# Altium schematic symbol library Altium_Lib.SchLib: 403 symbols (part 4 of 4)
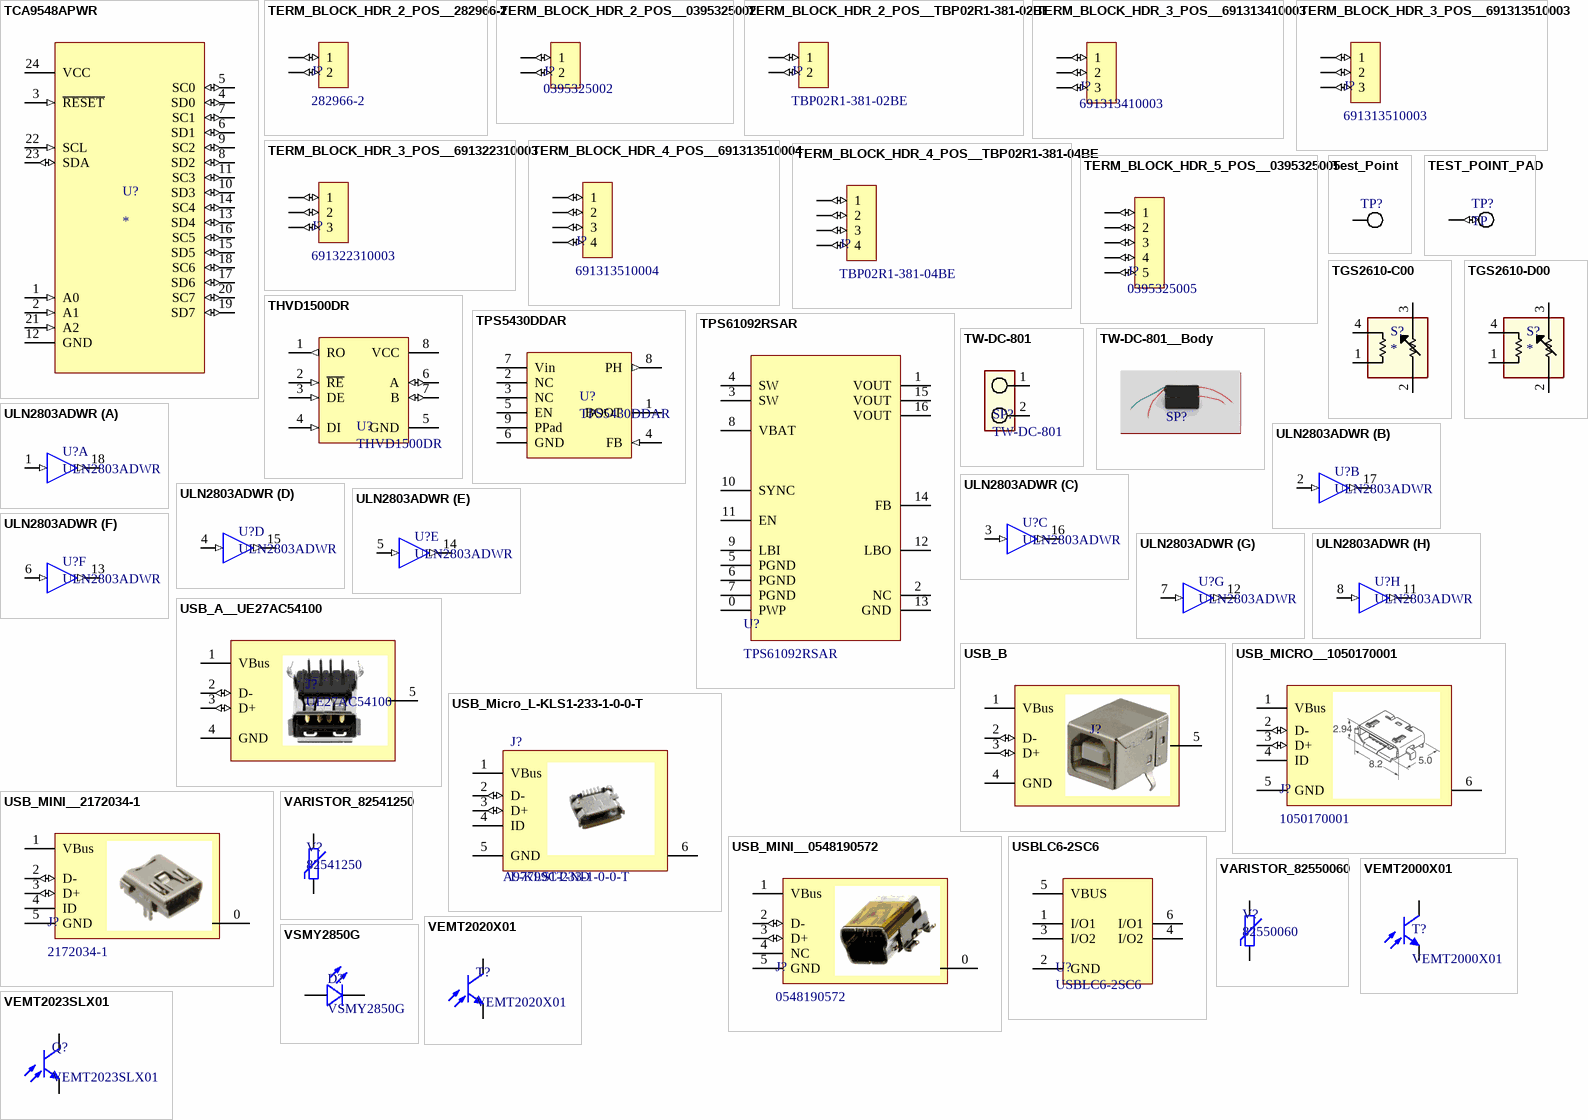
[diagram p14: symbols TCA9548APWR to VSMY2850G]

## TCA9548APWR
designator U?
IC I2C SW 8CH W/RESET 24TSSOP; Manufacturer: Texas Instruments; Manufacturer Part Number: TCA9548APWR; Max Supply Voltage: 5.5V; Min Supply Voltage: 1.65V; On-State Resistance: 70R; Max Supply Current: 80uA; Supply Type: Single; Independent Circuits: 1; Supplier 1: Digi-Key; RoHS: Yes; Category: Decoders and Multiplexers; Mount: Surface Mount; Case/Package: TSSOP; Number of Pins: 24; Contact Plating: Gold; Min Operating Temperature: -40°C; Max Operating Temperature: 85°C; Packaging: Tape and Reel; Package Quantity: 1; Series: TCA; REACH SVHC: No SVHC; Lead Free: Lead Free; RoHS Compliant: Yes; ComponentLink1URL: https://datasheet.ciiva.com/6614/tca9548a-6614721.pdf?src-supplier=Digi-Key; ComponentLink1Description: Datasheet; Supplier Part Number 1: 296-34905-1-ND
footprint TSSOP-24_N (TSOP, 24-Leads, Body 7,80x4,40mm, Pitch 0,65mm, IPC Medium Density)
pins: 1 A0 (in), 2 A1 (in), 3 ~{RESET} (in), 4 SD0 (io), 5 SC0 (io), 6 SD1 (io), 7 SC1 (io), 8 SD2 (io), 9 SC2 (io), 10 SD3 (io), 11 SC3 (io), 12 GND (power), 13 SD4 (io), 14 SC4 (io), 15 SD5 (io), 16 SC5 (io), 17 SD6 (io), 18 SC6 (io), 19 SD7 (io), 20 SC7 (io), 21 A2 (in), 22 SCL (in), 23 SDA (io), 24 VCC (power)

## TERM_BLOCK_HDR_2_POS__282966-2
designator J?, comment 282966-2
TERM BLOCK HDR 2POS 90DEG 7.62MM; Manufacturer: TE Connectivity; Current Rating: 15 A; Mounting Angle: Right; Number of Positions: 2 Position; Voltage Rating: 300 VAC; Supplier 1: Mouser; Manufacturer Part Number: 282966-2; RoHS: RoHS Compliant; Category: Pluggable Terminal Blocks; Stock 1: 79; Pricing 1: 1=1.15, 10=0.554, 100=0.462, 500=0.438, 1000=0.392, 2500=0.369, 5000=0.307, 10000=0.300, 25000=0.294 (USD); Contact Plating: Tin; Housing Material: Polyamide (PA); Packaging: Bulk; Product: Headers; Brand: TE Connectivity; Contact Material: Phosphor Bronze; Flammability Rating: UL 94 V-0; Pitch: 7.62 mm; Product Type: Pluggable Terminal Blocks; Standard Pack Qty: 200; Subcategory: Terminal Blocks; RoHS - Mouser: Y; Minimum Order Quantity: 1; Reeling: False; Supplier Part Number 1: 571-282966-2
footprint KLO_90_762_2
pins: 1 (io), 2 (io)

## TERM_BLOCK_HDR_2_POS__0395325002
designator J?, comment 0395325002
TERM BLOCK HDR 2POS 90DEG 5.08MM; Manufacturer: Molex, LLC; Header Orientation: 90°, Right Angle; Pitch: 0.200" (5.08mm); Number of Levels: 1; Positions Per Level: 2; Contact Tail Length: 0.150" (3.81mm); Material Flammability Rating: UL94 V-0; Packaging: Bulk; RoHS: RoHS Compliant; Number of Positions: 2; Part Status: Active; Type: Header, Male Pins, Shrouded (2 Side); Supplier: Digi-Key; Category: Connectors, Interconnects; Manufacturer Part Number: 0395325002; Insulation Height: 0.327" (8.30mm); Contact Material: Brass; Housing Material: Polyamide (PA66), Nylon 6/6; Wire Strip Length: -; Torque - Screw: -; Screw Size: -; Ingress Protection: -; Wire Gauge or Range - AWG: -; Current - IEC: -; Features: -; Contact Mating Finish: Tin; Mounting Type: Through Hole; Operating Temperature: -40°C ~ 105°C; Plug Wire Entry: -; Color: Green; Termination Style: Solder; Wire Gauge or Range - mm²: -; ComponentLink1URL: https://www.molex.com/pdm_docs/sd/395320002_sd.pdf; ComponentLink1Description: https://www.molex.com/pdm_docs/sd/395320002_sd.pdf; Supplier Part Number: 0395325002-ND
footprint KLO_90_508_2
pins: 1 (io), 2 (io)

## TERM_BLOCK_HDR_2_POS__TBP02R1-381-02BE
designator J?, comment TBP02R1-381-02BE
TERMINAL BLOCK, PLUGGABLE, 3.81,; Manufacturer: CUI Devices; Manufacturer Part Number: TBP02R1-381-02BE; Minimum Order Quantity: 1
footprint KLO_90_381_2__TBP02R1-381-02BE (Connector; Header; 2 Position)
pins: 1 (io), 2 (io)

## TERM_BLOCK_HDR_3_POS__691313410003
designator J?, comment 691313410003
TERM BLOCK HDR 3POS 90DEG 7.62MM; Manufacturer: Wurth Electronics Inc.; Material Flammability Rating: UL94 V-0; Contact Tail Length: 0.157" (4.00mm); Pitch: 0.300" (7.62mm); Number of Levels: 1; Number of Positions: 3; Header Orientation: 90°, Right Angle; Ingress Protection: -; Operating Temperature: -40°C ~ 105°C; Color: Green; Features: -; Wire Strip Length: -; Mounting Type: Through Hole; Screw Size: -; Current - IEC: -; Contact Mating Finish: Tin; Insulation Height: 0.335" (8.51mm); Contact Material: Brass; Housing Material: Polybutylene Terephthalate (PBT); Torque - Screw: -; Wire Gauge or Range - mm²: -; Wire Gauge or Range - AWG: -; Termination Style: Solder; Part Status: Active; Type: Header, Male Pins, Shrouded (4 Side); Category: Connectors, Interconnects; Manufacturer Part Number: 691313410003; Packaging: Bulk; Plug Wire Entry: -; Positions Per Level: 3; RoHS: RoHS Compliant; Supplier: Digi-Key; ComponentLink1URL: http://katalog.we-online.de/em/datasheet/6913134100xx.pdf; ComponentLink1Description: http://katalog.we-online.de/em/datasheet/6913134100xx.pdf; Pricing: 260=0.571 (USD); Supplier Part Number: 732-2836-ND
footprint KLO_90_762_3
pins: 1 (io), 2 (io), 3 (io)

## TERM_BLOCK_HDR_3_POS__691313510003
designator J?, comment 691313510003
TERM BLOCK HDR 3POS 90DEG 5.08MM; Manufacturer: Wurth Elektronik; Supplier 1: Mouser; Manufacturer Part Number: 691313510003; RoHS: RoHS Compliant; Category: Pluggable Terminal Blocks; Stock 1: 298; Pricing 1: 1=0.630, 10=0.550, 50=0.475 (USD); Packaging: Bulk; Series: WR-TBL; Brand: Wurth Elektronik; Product Type: Pluggable Terminal Blocks; Standard Pack Qty: 450; Subcategory: Terminal Blocks; RoHS - Mouser: Y; Minimum Order Quantity: 1; Reeling: False; ComponentLink1URL: https://www.mouser.com/datasheet/2/445/691313510003-1719651.pdf; ComponentLink1Description: https://www.mouser.com/datasheet/2/445/691313510003-1719651.pdf; Supplier Part Number 1: 710-691313510003
footprint KLO_90_508_3
pins: 1 (io), 2 (io), 3 (io)

## TERM_BLOCK_HDR_3_POS__691322310003
designator J?, comment 691322310003
TERM BLOCK HDR 3POS 90DEG 3.81MM; Manufacturer: Wurth Elektronik; Connection Method: Push-In; Current Rating: 10 A; Mounting Angle: Right Angle; Mounting Method: PCB Mount; Number of Positions: 3 Position; Voltage Rating: 300 VAC; Supplier 1: Mouser; Manufacturer Part Number: 691322310003; RoHS: RoHS Compliant; Category: Pluggable Terminal Blocks; Stock 1: 677; Pricing 1: 1=0.630, 10=0.550, 50=0.475 (USD); Color: Green; Contact Plating: Tin; Height: 9.2 mm; Housing Material: Polyamide (PA); Length: 12.62 mm; Packaging: Bulk; Product: Headers; Series: WR-TBL; Termination Style: Through Hole; Width: 7.2 mm; Brand: Wurth Elektronik; Contact Material: Brass; Flammability Rating: UL 94 V-0; Pitch: 3.81 mm; Product Type: Pluggable Terminal Blocks; Standard Pack Qty: 600; Subcategory: Terminal Blocks; RoHS - Mouser: Y; Minimum Order Quantity: 1; Reeling: False; ComponentLink1URL: https://www.mouser.com/datasheet/2/445/691322310003-1719737.pdf; ComponentLink1Description: https://www.mouser.com/datasheet/2/445/691322310003-1719737.pdf; Supplier Part Number 1: 710-691322310003
footprint KLO_90_381_3
pins: 1 (io), 2 (io), 3 (io)

## TERM_BLOCK_HDR_4_POS__691313510004
designator J?, comment 691313510004
TERM BLOCK HDR 4POS 90DEG 5.08MM; Manufacturer: Wurth Elektronik; Current Rating: 20 A; Mounting Angle: Right Angle; Mounting Method: PCB Mount; Number of Positions: 4 Position; Voltage Rating: 300 VAC; Supplier 1: Mouser; Manufacturer Part Number: 691313510004; RoHS: RoHS Compliant; Category: Pluggable Terminal Blocks; Stock 1: 223; Pricing 1: 1=0.780, 10=0.688, 50=0.594 (USD); Color: Green; Contact Plating: Tin; Height: 8.5 mm; Housing Material: Polybutylene Terephthalate (PBT); Length: 22.32 mm; Packaging: Bulk; Product: Headers; Series: WR-TBL; Termination Style: Through Hole; Width: 12 mm; Brand: Wurth Elektronik; Contact Material: Brass; Flammability Rating: UL 94 V-0; Pitch: 5.08 mm; Product Type: Pluggable Terminal Blocks; Standard Pack Qty: 300; Subcategory: Terminal Blocks; RoHS - Mouser: Y; Minimum Order Quantity: 1; Reeling: False; ComponentLink1URL: https://www.mouser.com/datasheet/2/445/691313510004-1719622.pdf; ComponentLink1Description: https://www.mouser.com/datasheet/2/445/691313510004-1719622.pdf; Supplier Part Number 1: 710-691313510004
footprint KLO_90_508_4
pins: 1 (io), 2 (io), 3 (io), 4 (io)

## TERM_BLOCK_HDR_4_POS__TBP02R1-381-04BE
designator J?, comment TBP02R1-381-04BE
Pluggable Terminal Blocks 2 24 Poles, Pluggable,Receptacle, Horizontal, 3.81 Pitch, Terminal Block Connector; Manufacturer: Mouser Electronics; Product Status: New Product; Supplier 1: Mouser; Manufacturer Part Number: TBP02R1-381-04BE; RoHS: RoHS Compliant; Category: Daily Limit Reached; Stock 1: 0; Pricing 1: 1=0.00 (EUR); Minimum Order Quantity: 1; Reeling: False
footprint KLO_90_381_4__TBP02R1-381-04BE (Connector; Header; 4 Position)
pins: 1 (io), 2 (io), 3 (io), 4 (io)

## TERM_BLOCK_HDR_5_POS__0395325005
designator J?, comment 0395325005
TERM BLOCK HDR 5POS 90DEG 5.08MM; Manufacturer: Molex, LLC; Contact Tail Length: 0.150" (3.81mm); Number of Positions: 5; Pitch: 0.200" (5.08mm); Number of Levels: 1; Header Orientation: 90°, Right Angle; Material Flammability Rating: UL94 V-0; Contact Material: Brass; Insulation Height: 0.327" (8.30mm); Housing Material: Polyamide (PA66), Nylon 6/6; Features: -; RoHS: RoHS Compliant; Wire Gauge or Range - AWG: -; Mounting Type: Through Hole; Color: Green; Termination Style: Solder; Packaging: Bulk; Type: Header, Male Pins, Shrouded (2 Side); Wire Gauge or Range - mm²: -; Current - IEC: -; Wire Strip Length: -; Plug Wire Entry: -; Part Status: Active; Contact Mating Finish: Tin; Operating Temperature: -40°C ~ 105°C; Ingress Protection: -; Torque - Screw: -; Manufacturer Part Number: 0395325005; Screw Size: -; Supplier: Digi-Key; Positions Per Level: 5; Category: Connectors, Interconnects; ComponentLink1URL: https://www.molex.com/pdm_docs/sd/395320002_sd.pdf; ComponentLink1Description: https://www.molex.com/pdm_docs/sd/395320002_sd.pdf; Supplier Part Number: 0395325005-ND
footprint KLO_90_508_5
pins: 1 (io), 2 (io), 3 (io), 4 (io), 5 (io)

## Test_Point
designator TP?, comment TP1  (value not drawn)  (no BOM)
Test point; ComponentLink1Description: *; Manufacturer Part Number: TP1; Manufacturer: *
footprint Test_Point_T1
pins: 1 (power)

## TEST_POINT_PAD
designator TP?, comment TP  (no BOM)
Test Point Pad; Manufacturer Part Number: TP; Manufacturer: *; ComponentLink1Description: *
footprint TEST_POINT_T2
pins: 1 (io)

## TGS2610-C00
designator S?
Gas Sensor; Manufacturer: FIGARO; Manufacturer Part Number: TGS2610-C00; Category: Gas Sensor; ComponentLink1Description: http://www.figaro.co.jp/en/product/docs/tgs2610_product_information_rev03.pdf; Mounting Type: Through Hole
footprint TO-5
pins: 1 (power), 2 (power), 3 (power), 4 (power)

## TGS2610-D00
designator S?
Gas Sensor; Manufacturer: FIGARO; Manufacturer Part Number: TGS2610-D00; Category: Gas Sensor; ComponentLink1Description: http://www.figaro.co.jp/en/product/docs/tgs2610_product_information_rev03.pdf; Mounting Type: Through Hole
footprint TO-5
footprint TO-5__90
pins: 1 (power), 2 (power), 3 (power), 4 (power)

## THVD1500DR
designator U?
THVD1500 300 kbps RS-485 Transceivers With ±8-kV IEC ESD Protection; Manufacturer: Texas Instruments; Duplex: Half; Protocol: RS485; Number of Drivers/Receivers: 1/1; Voltage - Supply: 4.5 V ~ 5.5 V; Supplier Device Package: 8-SOIC; Packaging: Cut Tape (CT); Part Status: Active; Package / Case: 8-SOIC (0.154", 3.90mm Width); Operating Temperature: -40°C ~ 125°C; RoHS: Request Inventory Verification; Supplier: Digi-Key; Data Rate: 300kbps; Category: Integrated Circuits (ICs); Type: Transceiver; Manufacturer Part Number: THVD1500DR; Mounting Type: Surface Mount; ComponentLink1URL: http://www.ti.com/lit/ds/symlink/thvd1500.pdf; ComponentLink1Description: http://www.ti.com/lit/ds/symlink/thvd1500.pdf; Pricing: 1=1.32, 10=1.176, 100=0.9168, 500=0.75736, 1000=0.59792 (USD); Supplier Part Number: 296-48170-1-ND
footprint SOIC-8_L (SOIC, 8-Leads, Body 4.9x3.9mm, Pitch 1.27mm, IPC High Density)
pins: 1 RO (out), 2 ~{RE} (in), 3 DE (in), 4 DI (in), 5 GND (power), 6 A (io), 7 B (io), 8 VCC (power)

## TPS5430DDAR
designator U?
IC REG BUCK ADJ 3A 8SOPWRPAD; Manufacturer: Texas Instruments; Frequency - Switching: 500kHz; Synchronous Rectifier: No; Output Configuration: Positive; Function: Step-Down; Number of Outputs: 1; Voltage - Output (Max): 32.04V; Voltage - Output (Min/Fixed): 1.221V; Voltage - Input (Max): 36V; Voltage - Input (Min): 5.5V; Output Type: Adjustable; Current - Output: 3A; Mounting Type: Surface Mount; Supplier Device Package: 8-SO PowerPad; Manufacturer Part Number: TPS5430DDAR; Packaging: Cut Tape (CT); Part Status: Active; Topology: Buck; Supplier: Digi-Key; Category: Integrated Circuits (ICs); Package / Case: 8-PowerSOIC (0.154", 3.90mm Width); Operating Temperature: -40°C ~ 125°C (TJ); RoHS: RoHS Compliant; ComponentLink1URL: http://www.ti.com/lit/ds/symlink/tps5431.pdf; ComponentLink1Description: http://www.ti.com/lit/ds/symlink/tps5431.pdf; Pricing: 1=4.05, 10=3.64, 100=2.9826, 500=2.53906, 1000=2.14137 (USD); Stock: 16509; Supplier Part Number: 296-26988-1-ND
footprint SOIC_8_Power (8-PowerSOIC (0.154", 3.90mm Width))
pins: 1 BOOT (power), 2 NC, 3 NC, 4 FB (in), 5 EN (power), 6 GND (power), 7 Vin (power), 8 PH (out), 9 PPad (power)

## TPS61092RSAR
designator U?
IC REG BOOST 5V 2A 16QFN; Manufacturer: Texas Instruments; Number of Outputs: 1; Efficiency: 96%; Min Input Voltage: 1.8V; Max Output Current: 500mA; Max Input Voltage: 5.5V; Switching Frequency: 600kHz; Synchronous Rectifier: Yes; Quiescent Current: 20uA; Output Type: Fixed; Output Configuration: Positive; Supplier 1: Avnet; Manufacturer Part Number: TPS61092RSAR; Stock 1: 0; Mount: Surface Mount; Case/Package: VQFN EP; Number of Pins: 16; Weight: 0.001464oz; Contact Plating: Gold; Min Operating Temperature: -40°C; Max Operating Temperature: 85°C; Package Quantity: 1; Packaging: Tape and Reel; Output Current: 2A; Output Voltage: 5V; Topology: Boost; Operating Supply Voltage: 5.5V; Series: -; Min Output Voltage: 5V; Nominal Output Voltage: 5V; Width: 4mm; Radiation Hardening: No; Lead Free: Lead Free; RoHS Compliant: Yes; REACH SVHC: No SVHC; ComponentLink1URL: http://www.ti.com/lit/ds/symlink/tps61090.pdf?src-supplier=Digi-Key; ComponentLink1Description: http://www.ti.com/lit/ds/symlink/tps61090.pdf?src-supplier=Digi-Key; ComponentLink2URL: https://www.verical.com/server-webapp/html/getDatasheet?partID=188301&src-supplier=Verical; ComponentLink2Description: https://www.verical.com/server-webapp/html/getDatasheet?partID=188301&src-supplier=Verical; ComponentLink3URL: http://datasheet.iiic.cc/texas_instruments/TPS61092RSAR.pdf?src-supplier=IIIC; ComponentLink3Description: http://datasheet.iiic.cc/texas_instruments/TPS61092RSAR.pdf?src-supplier=IIIC; Supplier Part Number 1: TPS61092RSAR
footprint VQFN_16
pins: 0 PWP, 1 VOUT, 2 NC, 3 SW, 4 SW, 5 PGND, 6 PGND, 7 PGND, 8 VBAT, 9 LBI, 10 SYNC, 11 EN, 12 LBO, 13 GND, 14 FB, 15 VOUT, 16 VOUT

## TW-DC-801
designator SP?
Spark jenerator 4.8V 20KV 3000mA; Manufacturer: TIANWANG SOLAR PRODUCTS; Manufacturer Part Number: TW-DC-801; ComponentLink1Description: http://www.twgdsolar.com/en/index.php?v=news&id=72
footprint TW-DC-801
pins: 1 + (power), 2 + (power)

## TW-DC-801__Body
designator SP?
TW-DC-801 Body
footprint TW-DC-801__Body

## ULN2803ADWR
designator U?
TRANS 8NPN DARL 50V 0.5A 18SO; Manufacturer: Texas Instruments; Transistor Type: 8 NPN Darlington; Vce Saturation (Max) @ Ib, Ic: 1.6V @ 500µA, 350mA; Current - Collector (Ic) (Max): 500mA; Packaging: Tape & Reel (TR); Current - Collector Cutoff (Max): -; Power - Max: -; DC Current Gain (hFE) (Min) @ Ic, Vce: -; Operating Temperature: -40°C ~ 85°C (TA); RoHS: RoHS Compliant; Supplier Device Package: 18-SOIC; Frequency - Transition: -; Mounting Type: Surface Mount; Voltage - Collector Emitter Breakdown (Max): 50V; Manufacturer Part Number: ULN2803ADWR; Part Status: Active; Package / Case: 18-SOIC (0.295", 7.50mm Width); Supplier: Digi-Key; Category: Discrete Semiconductor Products; ComponentLink1URL: http://www.ti.com/lit/ds/symlink/uln2803a.pdf; ComponentLink1Description: http://www.ti.com/lit/ds/symlink/uln2803a.pdf; Pricing: 2000=0.385, 6000=0.36575, 10000=0.352 (USD); Supplier Part Number: 296-15777-2-ND
footprint SOP18 (18-Pin Small Outline Integrated Circuit 1.27 mm Pitch, IPC Medium Density)
part A pins: 1 I1 (in), 9 GND (power) hidden, 10 COMMON (power) hidden, 18 O1 (out)
part B pins: 2 I2 (in), 17 O2 (out)
part C pins: 3 I3 (in), 16 O3 (out)
part D pins: 4 I4 (in), 15 O4 (out)
part E pins: 5 I5 (in), 14 O5 (out)
part F pins: 6 I6 (in), 13 O6 (out)
part G pins: 7 I7 (in), 12 O7 (out)
part H pins: 8 I8 (in), 11 O8 (out)

## USB_A__UE27AC54100
designator J?, comment UE27AC54100
CONN RCPT USB2.0 TYPEA 4POS R/A; Manufacturer: Mouser Electronics; Get more results: Please configure for MyMouser login credentials; Product Status: New Product; Supplier 1: Mouser; Manufacturer Part Number: UE27AC54100; RoHS: RoHS Compliant; Category: Connectors, Interconnects; Stock 1: 0; Pricing 1: 1=0.00 (USD); Create Account URL: https://www.mouser.com/MyMouser/CreateAccount.aspx; Login URL: https://www.mouser.com/MyMouser/MouserLogin.aspx; Minimum Order Quantity: 1; Reeling: False; Supplier Part Number 1: Anonymous Daily Limit Reached
footprint USB_A__UE27AC54100
pins: 1 VBus (power), 2 D- (io), 3 D+ (io), 4 GND (power), 5 Shield

## USB_B
designator J?, comment USB-B1HSW6  (value not drawn)
CONN USB TYPE B R/A WHITE; Manufacturer: On Shore Technology Inc.; Voltage - Rated: 30VAC; Shielding: Unshielded; Current Rating: 1A; Number of Contacts: 4; Gender: Receptacle; Connector Type: USB - B; Number of Ports: 1; Material Flammability Rating: UL94 V-0; Features: Board Lock; Mating Cycles: -; Ingress Protection: -; Termination: Solder; Manufacturer Part Number: USB-B1HSW6; Supplier: Digi-Key; Category: Connectors, Interconnects; RoHS: RoHS Compliant; Packaging: Tray; Part Status: Active; Specifications: -; Mounting Type: Through Hole, Right Angle; Mounting Feature: Horizontal; Operating Temperature: 0°C ~ 85°C; Contact Finish: Gold; Shell/Shielding Material: Brass; Insulation Color: White; ComponentLink1URL: http://www.on-shore.com/wp-content/uploads/2015/09/usb-b1hsxx.pdf; ComponentLink1Description: http://www.on-shore.com/wp-content/uploads/2015/09/usb-b1hsxx.pdf; Pricing: 1=0.58, 10=0.546, 25=0.4916, 50=0.4368, 100=0.4186, 250=0.3822, 500=0.364, 1000=0.3003, 2500=0.273 (USD); Supplier Part Number: ED2982-ND
footprint USB_B
pins: 1 VBus (power), 2 D- (io), 3 D+ (io), 4 GND (power), 5 Shield

## USB_MICRO__1050170001
designator J?, comment 1050170001
CONN RCPT MICRO USB R/A SMD; Manufacturer: Molex; Number of Terminals/Pins: 5; Gender: Receptacle; Current Rating: 1.8A; Voltage Rating (AC): 30V; Number of Ports: 1; USB Standard: USB 2.0; Mating Cycles: 10000; Shielding: Shielded; Pitch: 0.65mm; Package: None; MP: 1050170001; Value: *; Price: None; Availability: Unavailable; Supplier 1: Digi-Key; Manufacturer Part Number: 1050170001; RoHS: Yes; Stock 1: 55740; Pricing 1: 1=1,01000, 10=0,84000, 100=0,69990, 1000=0,55994 (USD); Mount: Surface Mount; Contact Plating: Gold; Contact Material: Copper Alloy,Copper; Housing Material: Polymer; Insulation Color: Black; Min Operating Temperature: -30°C; Max Operating Temperature: 85°C; Packaging: Tape and Reel; Package Quantity: 2000; Connector Type: USB; Termination: Solder; Number of Contacts: 5; Max Voltage Rating (AC): 30V; Voltage Rating: 30V; Number of Positions: 5; Orientation: Right Angle; Number of Circuits: 5; Features: Shielded; Series: 105017; Length: 8.2mm; Depth: 7.5mm; Radiation Hardening: No; Halogen Free: Low Halogen; Flammability Rating: UL94 V-0; RoHS Compliant: Yes; ComponentLink1URL: https://www.molex.com/pdm_docs/sd/1050170001_sd.pdf; ComponentLink1Description: Datasheet; Supplier Part Number 1: WM1399CT-ND
footprint USB_MICRO_1050170001 (Footprint not found)
pins: 1 VBus (power), 2 D- (io), 3 D+ (io), 4 ID (power), 5 GND, 6 Shield

## USB_Micro_L-KLS1-233-1-0-0-T
designator J?, comment L-KLS1-233-1-0-0-T  Supplier Part Number 2: A97799CT-ND
Conn Micro USB 2.0 Type AB RCP 5 POS 0.65mm Solder RA SMD 5 Terminal 1 Port T/R; Manufacturer: KLS Electronic; ComponentLink1Description: Datasheet; ComponentLink1URL: https://cdn.ozdisan.com/ETicaret_Dosya/480449_6645382.pdf; Supplier Part Number 1: https://www.ozdisan.com/connectors-and-interconnects/usb-dvi-hdmi-connectors/usb-connectors/L-KLS1-233-1-0-0-T; Manufacturer Part Number: L-KLS1-233-1-0-0-T; Supplier 2: Digi-Key; RoHS: Yes; Category: Audio / Video Connectors; Stock 2: 25591; Pricing 2: 1=1,71000, 10=1,55200, 25=1,45720, 50=1,39380, 100=1,33050, 250=1,20380, 500=1,10876 (USD); ComponentLink2URL: https://www.te.com/commerce/DocumentDelivery/DDEController?Action=srchrtrv&amp;DocNm=1981584&amp;DocType=Customer+Drawing&amp;DocLang=English&src-supplier=Digi-Key; ComponentLink2Description: https://www.te.com/commerce/DocumentDelivery/DDEController?Action=srchrtrv&amp;DocNm=1981584&amp;DocType=Customer+Drawing&amp;DocLang=English&src-supplier=Digi-Key; Ozdisan: L-KLS1-233-1-0-0-T
footprint USB_MICRO_1981584-1
pins: 1 VBus (power), 2 D- (io), 3 D+ (io), 4 ID (power), 5 GND, 6 Shield

## USB_MINI__2172034-1
designator J?, comment 2172034-1
CONN RCPT USB2.0 MINI B 5P R/A; Manufacturer: TE Connectivity AMP; Plating: Nickel; Gender: Female; Connector Type: Receptacle; Number of Ports: 1; Number of Positions: 5; Plating Thickness: 0.762um; PCB Thickness: 1.6mm; Tail Length: 2.84mm; Supplier 1: Avnet; Manufacturer Part Number: 2172034-1; Stock 1: 0; Pricing 1: 13110=0.5326, 26220=0.5141, 52440=0.4965, 78660=0.4789, 104880=0.4613, 131100=0.4437, 1311000=0.4261 (USD); Housing Color: Black; Contact Plating: Gold; Housing Material: PBT; Packaging: Tray; Termination: Through Hole; Orientation: Right Angle; Package Quantity: 95; ELV: Compliant; RoHS Compliant: Yes; ComponentLink1URL: http://www.te.com/commerce/DocumentDelivery/DDEController?Action=srchrtrv&DocNm=2172034&DocType=Customer+Drawing&DocLang=English&src-supplier=Digi-Key; ComponentLink1Description: http://www.te.com/commerce/DocumentDelivery/DDEController?Action=srchrtrv&DocNm=2172034&DocType=Customer+Drawing&DocLang=English&src-supplier=Digi-Key; ComponentLink2URL: http://www.mouser.com/ds/2/418/NG_CD_2172034_A-624684.pdf?src-supplier=Mouser; ComponentLink2Description: http://www.mouser.com/ds/2/418/NG_CD_2172034_A-624684.pdf?src-supplier=Mouser; ComponentLink3URL: https://www.te.com/commerce/DocumentDelivery/DDEController?Action=srchrtrv&DocNm=2172034&DocType=Customer+Drawing&DocLang=English&src-supplier=Digi-Key; ComponentLink3Description: https://www.te.com/commerce/DocumentDelivery/DDEController?Action=srchrtrv&DocNm=2172034&DocType=Customer+Drawing&DocLang=English&src-supplier=Digi-Key; Supplier Part Number 1: 2172034-1
footprint USB_MINI__2172034-1
pins: 0 Shield, 1 VBus (power), 2 D- (io), 3 D+ (io), 4 ID (power), 5 GND (power)

## USB_MINI__0548190572
designator J?, comment 0548190572
CONN RCPT USB2.0 MINI B SMD R/A; Manufacturer: Molex; Manufacturer Part Number: 0548190572; Category: Connectors, Interconnects
footprint USB_MINI__0548190572
pins: 0 Shield, 1 VBus (power), 2 D- (io), 3 D+ (io), 4 NC (power), 5 GND (power)

## USBLC6-2SC6
designator U?
TVS DIODE 5.25V 17V SOT23-6; Manufacturer: STMicroelectronics; Voltage - Breakdown (Min): 6V; Current - Peak Pulse (10/1000µs): 5A (8/20µs); Power Line Protection: Yes; Voltage - Reverse Standoff (Typ): 5.25V; Type: Steering (Rail to Rail); Part Status: Active; Supplier: Digi-Key; Packaging: Tape & Reel (TR); Category: Circuit Protection; RoHS: RoHS Compliant; Manufacturer Part Number: USBLC6-2SC6; Mounting Type: Surface Mount; Applications: Ethernet; Operating Temperature: -40°C ~ 125°C (TJ); Capacitance @ Frequency: -; Package / Case: SOT-23-6; Power - Peak Pulse: -; Voltage - Clamping (Max) @ Ipp: 17V; Supplier Device Package: SOT-23-6; Base Part Number: USBLC6-2; ComponentLink1URL: http://www.st.com/content/ccc/resource/technical/document/datasheet/06/1d/48/9c/6c/20/4a/b2/CD00050750.pdf/files/CD00050750.pdf/jcr:content/translations/en.CD00050750.pdf; ComponentLink1Description: http://www.st.com/content/ccc/resource/technical/document/datasheet/06/1d/48/9c/6c/20/4a/b2/CD00050750.pdf/files/CD00050750.pdf/jcr:content/translations/en.CD00050750.pdf; Pricing: 3000=0.16828, 6000=0.15743, 15000=0.14657, 30000=0.14476 (USD); Supplier Part Number: 497-5235-2-ND
footprint SOT23-6 (SOT-23/SC-74A; 5 Leads; Body 3 x 3 mm, inc. leads (LxW max))
pins: 1 I/O1, 2 GND, 3 I/O2, 4 I/O2, 5 VBUS, 6 I/O1

## VARISTOR_82541250
designator V?, comment 82541250
VARISTOR 39V 200A 1206; Manufacturer: Wurth Electronics Inc.; Number of Circuits: 1; Maximum AC Volts: 25VAC; Capacitance @ Frequency: 620pF @ 1kHz; Maximum DC Volts: 30VDC; Energy: 1.0J; Varistor Voltage (Min): 35.88V; Varistor Voltage (Max): 42.12V; Operating Temperature: -40°C ~ 125°C (TA); Packaging: Tape & Reel (TR); Category: Circuit Protection; Part Status: Active; RoHS: RoHS Compliant; Package / Case: 1206 (3216 Metric); Varistor Voltage (Typ): 39V; Mounting Type: Surface Mount, MLCV; Supplier: Digi-Key; Manufacturer Part Number: 82541250; ComponentLink1URL: http://katalog.we-online.de/pbs/datasheet/82541250.pdf; ComponentLink1Description: http://katalog.we-online.de/pbs/datasheet/82541250.pdf; Pricing: 3000=0.564 (USD); Supplier Part Number: 732-2553-2-ND
footprint V-1206
pins: 1, 2

## VARISTOR_82550060
designator V?, comment 82550060
VARISTOR 12V 80A 0805; Manufacturer: Wurth Electronics Inc.; Capacitance @ Frequency: 1180pF @ 1kHz; Energy: 0.10J; Packaging: Cut Tape (CT); Manufacturer Part Number: 82550060; RoHS: RoHS Compliant; Category: Circuit Protection; Package / Case: 0805 (2012 Metric); Mounting Type: Surface Mount, MLCV; Operating Temperature: -40°C ~ 125°C (TA); Supplier: Digi-Key; Part Status: Active; ComponentLink1URL: http://katalog.we-online.de/pbs/datasheet/82550060.pdf; ComponentLink1Description: http://katalog.we-online.de/pbs/datasheet/82550060.pdf; Pricing: 1=0.66, 10=0.645, 50=0.618, 100=0.591, 500=0.564, 1000=0.538 (USD); Supplier Part Number: 732-2543-1-ND
footprint V-1206
pins: 1, 2

## VEMT2000X01
designator T?
PHOTOTRANSISTOR 790 TO 970 NM; Manufacturer: Vishay Semiconductors; Collector- Emitter Voltage VCEO Max: 20 V; Wavelength: 860 nm; Collector-Emitter Saturation Voltage: 0.4 V; Dark Current: 100 nA; Half Intensity Angle Degrees: 15 deg; Light Current: 6 mA; Pd - Power Dissipation: 100 mW; Qualification: AEC-Q101; Supplier 1: Mouser; Manufacturer Part Number: VEMT2000X01; RoHS: RoHS Compliant; Category: Phototransistors; Stock 1: 6057; Pricing 1: 1=0.840, 10=0.770, 100=0.530, 1000=0.500, 2500=0.328, 6000=0.273, 12000=0.265, 24000=0.254 (USD); Packaging: Cut Tape; Product: Phototransistors; Series: VEMT; Brand: Vishay Semiconductors; Collector-Emitter Breakdown Voltage: 20 V; Peak Wavelength: 860 nm; Maximum Operating Temperature: + 100 C; Minimum Operating Temperature: - 40 C; Moisture Sensitive: Yes; Product Type: Phototransistors; Standard Pack Qty: 6000; Subcategory: Optical Detectors and Sensors; RoHS - Mouser: Y; Minimum Order Quantity: 1; Reeling: True; ComponentLink1URL: https://www.mouser.com/datasheet/2/427/vemt2000-1766614.pdf; ComponentLink1Description: https://www.mouser.com/datasheet/2/427/vemt2000-1766614.pdf; Supplier Part Number 1: 782-VEMT2000X01
footprint VEMT2000X01
pins: 1 C, 2 E

## VEMT2020X01
designator T?
PHOTOTRANSISTOR 790 TO 970 NM; Manufacturer: Vishay; Lens Color: Black; Wavelength: 860nm; Power Consumption: 100mW; Viewing Angle: 15°; Number of Channels: 1; Collector Emitter Voltage (VCEO): 7V; Max Collector Current: 50mA; Collector Emitter Breakdown Voltage: 20V; Collector Emitter Saturation Voltage: 400mV; Polarity: NPN; Lens Style: Domed; Dark Current: 100nA; Supplier 1: Digi-Key; Manufacturer Part Number: VEMT2020X01; Stock 1: 252678; Pricing 1: 1=0.84, 10=0.655, 100=0.4208, 500=0.3553, 1000=0.2805, 2500=0.2618 (USD); Mount: Surface Mount; Case/Package: SMD/SMT; Number of Pins: 2; Min Operating Temperature: -40°C; Max Operating Temperature: 100°C; Package Quantity: 6000; Packaging: Tape and Reel; Max Power Dissipation: 100mW; Max Breakdown Voltage: 20V; Number of Elements: 1; Power Dissipation: 100mW; Orientation: Top View; Length: 2.3mm; Height: 2.77mm; Width: 2.3mm; Radiation Hardening: No; REACH SVHC: Unknown; Lead Free: Lead Free; ComponentLink1URL: http://www.farnell.com/datasheets/2050307.pdf?src-supplier=Element14; ComponentLink1Description: http://www.farnell.com/datasheets/2050307.pdf?src-supplier=Element14; ComponentLink2URL: http://www.vishay.com/docs/81595/vemt2000.pdf?src-supplier=Digi-Key; ComponentLink2Description: http://www.vishay.com/docs/81595/vemt2000.pdf?src-supplier=Digi-Key; ComponentLink3URL: http://uk.rs-online.com/webdocs/13f3/0900766b813f3165.pdf?src-supplier=RSComponents; ComponentLink3Description: http://uk.rs-online.com/webdocs/13f3/0900766b813f3165.pdf?src-supplier=RSComponents; ComponentLink4URL: http://www.farnell.com/datasheets/485099.pdf?src-supplier=Element14; ComponentLink4Description: http://www.farnell.com/datasheets/485099.pdf?src-supplier=Element14; ComponentLink5URL: http://components.arrow.com/part/dataview/48172992S463070N5680?src-supplier=Arrow; ComponentLink5Description: http://components.arrow.com/part/dataview/48172992S463070N5680?src-supplier=Arrow; ComponentLink6URL: http://www.vishay.com/docs/81595/vemt2000.pdf?src-supplier=Future+Electronics; ComponentLink6Description: http://www.vishay.com/docs/81595/vemt2000.pdf?src-supplier=Future+Electronics; ComponentLink7URL: http://www.vishay.com/docs/81595/vemt2000.pdf?src-supplier=Avnet; ComponentLink7Description: http://www.vishay.com/docs/81595/vemt2000.pdf?src-supplier=Avnet; ComponentLink8URL: http://www.mouser.com/ds/2/427/vemt2000-244760.pdf?src-supplier=Mouser; ComponentLink8Description: http://www.mouser.com/ds/2/427/vemt2000-244760.pdf?src-supplier=Mouser; ComponentLink9URL: http://www.vishay.com/docs/81595/vemt2000.pdf?src-supplier=Avnet+Europe; ComponentLink9Description: http://www.vishay.com/docs/81595/vemt2000.pdf?src-supplier=Avnet+Europe; Supplier Part Number 1: VEMT2020X01DKR-ND
footprint VEMT2020X01
pins: 1 C, 2 E

## VEMT2023SLX01
designator Q?
NPN PHOTO TRANSISTOR SMD SIDE LO; Manufacturer: Vishay Semiconductor Opto Division; Detailed Description: Phototransistor 860nm Side View 2-SMD, Side View; Voltage - Collector Emitter Breakdown (Max): 20V; Current - Collector (Ic) (Max): 50mA; Current - Dark (Id) (Max): 1nA; Wavelength: 860nm; Viewing Angle: 70°; Power - Max: 100mW; Manufacturer Part Number: VEMT2023SLX01; Mounting Type: Surface Mount, Right Angle; Orientation: Side View; Operating Temperature: -40°C ~ 100°C (TA); Package / Case: 2-SMD, Side View; ComponentLink1URL: http://www.vishay.com/docs/84166/vemt2023slx01.pdf
footprint SW-IR-PT-VSHY-Black
pins: 1 C, 2 E

## VSMY2850G
designator D?
EMITTER IR 850NM 100MA SMD; Manufacturer: Vishay; Lens Style: Dome,Diffused,Colorless,Circular; Number of LEDs: 1; Viewing Angle: 20°; Rise Time: 10ns; Forward Voltage: 1.65V; Power Rating: 55mW; Power Dissipation: 190mW; Reverse Voltage: 5V; Supplier 1: Digi-Key; Manufacturer Part Number: VSMY2850G; Stock 1: 21575; Pricing 1: 1=0.97, 10=0.753, 100=0.4838, 500=0.4085, 1000=0.3225, 2500=0.301 (USD); Mount: Surface Mount; Case/Package: SMD/SMT; Number of Pins: 2; Contact Plating: Tin; Min Operating Temperature: -40°C; Max Operating Temperature: 85°C; Packaging: Tape and Reel; Forward Current: 100mA; Wavelength: 850nm; Package Quantity: 1; Fall Time: 10ns; Orientation: Top View; Test Current: 100mA; Number of Elements: 1; Length: 2.3mm; Depth: 2.3mm; REACH SVHC: Unknown; Lead Free: Lead Free; ComponentLink1URL: http://www.farnell.com/datasheets/2050476.pdf?src-supplier=Element14; ComponentLink1Description: http://www.farnell.com/datasheets/2050476.pdf?src-supplier=Element14; ComponentLink2URL: http://www.vishay.com/docs/83398/vsmy2850.pdf?src-supplier=Digi-Key; ComponentLink2Description: http://www.vishay.com/docs/83398/vsmy2850.pdf?src-supplier=Digi-Key; Supplier Part Number 1: VSMY2850GCT-ND
footprint VSMY2850G
pins: 1 A, 2 K

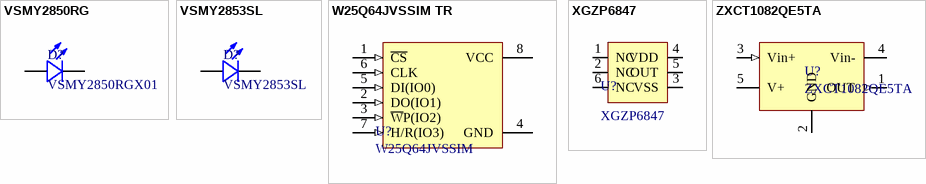
[diagram p11: symbols VSMY2850RG to ZXCT1082QE5TA]

## VSMY2850RG
designator D?, comment VSMY2850RGX01
EMITTER IR 850NM 100MA SMD; Manufacturer: Vishay Semiconductors; Illumination Color: Infrared; Power Rating: 190 mW; Lens Shape: Dome; Viewing Angle: 10 deg; Fall Time: 10 ns; Radiant Intensity: 100 mW/sr; Vf - Forward Voltage: 1.65 V; Vr - Reverse Voltage: 5 V; Product Status: New Product; Supplier 1: Mouser; Manufacturer Part Number: VSMY2850RGX01; RoHS: RoHS Compliant; Category: Infrared Emitters - High Power; Stock 1: 0; Pricing 1: 1=0.780, 10=0.560, 100=0.419, 500=0.323, 1000=0.262, 2500=0.236, 6000=0.236, 12000=0.232, 24000=0.227 (USD); Packaging: Cut Tape; Product: High Power Infrared Emitters; Wavelength: 850 nm; Brand: Vishay Semiconductors; Mounting Style: SMD/SMT; If - Forward Current: 100 mA; Maximum Operating Temperature: + 85 C; Minimum Operating Temperature: - 40 C; Moisture Sensitive: Yes; Product Type: IR Emitters (IR LEDs); Rise Time: 10 ns; Standard Pack Qty: 6000; Subcategory: Infrared Data Communications; RoHS - Mouser: Y; Minimum Order Quantity: 1; Reeling: True; ComponentLink1URL: https://www.mouser.com/datasheet/2/427/vsmy2850-1767025.pdf; ComponentLink1Description: https://www.mouser.com/datasheet/2/427/vsmy2850-1767025.pdf; Supplier Part Number 1: 78-VSMY2850RGX01
footprint VSMY2850RG
pins: 1 A, 2 K

## VSMY2853SL
designator D?
EMITTER IR 850NM 100MA SMD; Manufacturer: Vishay Semiconductor Opto Division; Detailed Description: Infrared (IR) Emitter 850nm 1.65V 100mA 20mW/sr @ 100mA 56° 2-SMD, Gull Wing; Voltage - Forward (Vf) (Typ): 1.65V; Viewing Angle: 56°; Manufacturer Part Number: VSMY2853SL; Current - DC Forward (If) (Max): 100mA; Wavelength: 850nm; Orientation: Side View; Operating Temperature: 40°C ~ 85°C (TA); Mounting Type: Surface Mount; Package / Case: 2-SMD, Gull Wing; ComponentLink1Description: http://www.vishay.com/docs/83481/vsmy2853sl.pdf
footprint SW-IR-PT-VSHY
pins: 1 A, 2 K

## W25Q64JVSSIM TR
designator U?, comment W25Q64JVSSIM
IC FLASH 64M SPI 133MHZ 8SOIC; Manufacturer: Winbond Electronics; Voltage - Supply: 2.7 V ~ 3.6 V; Write Cycle Time - Word, Page: 3ms; Memory Size: 64Mb (8M x 8); Memory Type: Non-Volatile; RoHS: RoHS Compliant; Supplier: Digi-Key; Supplier Device Package: 8-SOIC; Memory Format: FLASH; Part Status: Active; Mounting Type: Surface Mount; Package / Case: 8-SOIC (0.209", 5.30mm Width); Technology: FLASH - NOR; Manufacturer Part Number: W25Q64JVSSIM; Memory Interface: SPI; Category: Integrated Circuits (ICs); Packaging: Tube; Operating Temperature: -40°C ~ 85°C (TA); ComponentLink1URL: http://www.winbond.com/resource-files/w25q64jv%20revj%2003272018%20plus.pdf; ComponentLink1Description: http://www.winbond.com/resource-files/w25q64jv%20revj%2003272018%20plus.pdf; Pricing: 90=0.99522 (USD); Supplier Part Number: W25Q64JVSSIM-ND
footprint SOIC-8_W_208mil_154mil (SOIC, 8-Leads, Body 4.9x3.9mm, Pitch 1.27mm, IPC Medium Density)
pins: 1 ~{CS} (in), 2 DO(IO1) (in), 3 ~{W}P(IO2) (in), 4 GND (power), 5 DI(IO0) (in), 6 CLK (in), 7 H/R(IO3) (in), 8 VCC (power)

## XGZP6847
designator U?
Pressure Sensor Module for ventilator; Manufacturer: CFSensor; Manufacturer Part Number: XGZP6847; ComponentLink1URL: http://www.cfsensor.com/editor/attached/file/20200424/20200424143849_4985.pdf; ComponentLink1Description: http://www.cfsensor.com/editor/attached/file/20200424/20200424143849_4985.pdf
footprint XGZP6847
pins: 1 NC, 2 NC, 3 VSS, 4 VDD, 5 OUT, 6 NC

## ZXCT1082QE5TA
designator U?
IC CURRENT MONITOR SOT25; Manufacturer: Diodes Incorporated; Sensing Method: High-Side; Voltage - Input: 2.7 V ~ 60 V; RoHS: RoHS Compliant; Packaging: Tape & Reel (TR); Mounting Type: Surface Mount; Package / Case: SC-74A, SOT-753; Supplier: Digi-Key; Category: Integrated Circuits (ICs); Part Status: Active; Current - Output: -; Operating Temperature: -40°C ~ 125°C; Supplier Device Package: SOT-25; Manufacturer Part Number: ZXCT1082QE5TA; Function: Current Monitor; Accuracy: -; ComponentLink1URL: https://www.diodes.com/assets/Datasheets/ZXCT1082Q_87Q.pdf; ComponentLink1Description: https://www.diodes.com/assets/Datasheets/ZXCT1082Q_87Q.pdf; Pricing: 3000=0.972, 6000=0.936 (USD); Supplier Part Number: ZXCT1082QE5TADITR-ND
footprint SOT23-5 (SOT-23/SC-74A; 5 Leads; Body 3 x 3 mm, inc. leads (LxW max))
pins: 1 OUT (out), 2 GND (power), 3 Vin+ (in), 4 Vin- (power), 5 V+ (power)